# Altium footprint library 3.03-USB3.1 Type C-M.2-NGFF-HDMI-PCI-E接口.PcbLib: 40 footprints (part 2 of 3)
Each footprint in its own frame and in the unit in brackets; x right, y up, seen from the top. Pads: shape width x height; smd on the part's side, far side on the other; paste and mask are expansions set on the pad; w line width, h text height; cw(c..) or ccw(c..) is an arc to the next point about the centre after c.
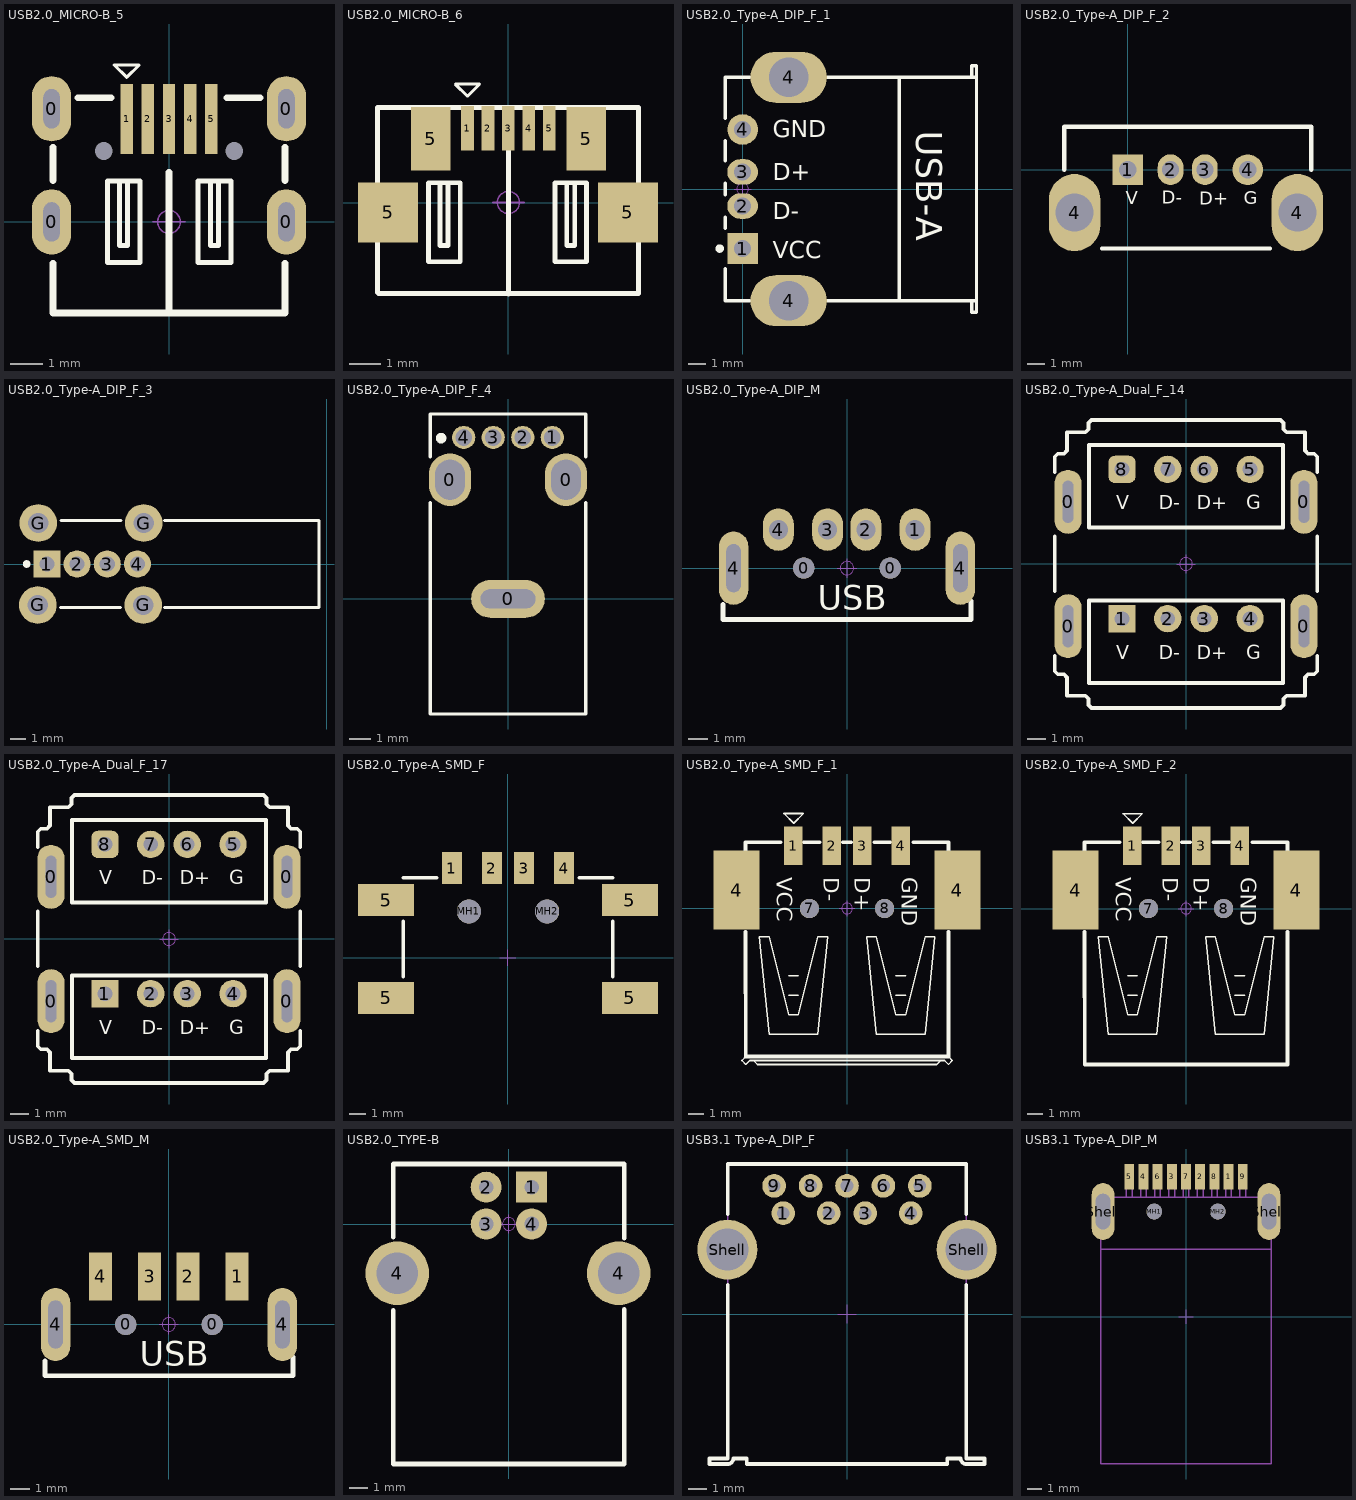
[diagram p1: the footprints below, top view; thin cyan lines are the x and y axes]

## USB2.0_MICRO-B_5 [mm] "micro型USB ，6.7*7.5*2.5mm封装库来自淘宝ID:黄晶宝石"
pads (11):
  oval 1.2x2 hole 0.5 slot 1.2 at 90 deg: 0(-3.6,0) 0(-3.6,3.47) 0(3.6,0) 0(3.6,3.47)
  round 0 hole 0.55 unplated: 0(-2,2.17) 0(2,2.17)
  rect 0.381x2.15 smd: 1(-1.3,3.16) 2(-0.65,3.16) 3(0,3.16) 4(0.65,3.16) 5(1.3,3.16)
Top Overlay:
  lines w0.1: -1.681,4.811 -1.3,4.43 -0.919,4.811 -1.681,4.811
  lines w0.152: -1.524,1.257 -1.524,-0.728 -1.321,-0.728 -1.27,-0.728 -1.27,1.257 ; 1.27,1.257 1.27,-0.728 1.524,-0.728 1.524,1.257 ; -1.885,-1.243 -1.885,1.257 -0.885,1.257 -0.885,-1.243 -1.885,-1.243 ; 0.896,-1.243 1.896,-1.243 1.896,1.257 0.896,1.257 0.896,-1.243
  lines w0.203: -3.556,-1.27 -3.556,-2.794 3.556,-2.794 3.556,-1.27 ; -3.556,1.27 -3.556,2.286 ; -2.794,3.81 -1.778,3.81 ; 0,-2.75 0,1.524 ; 1.778,3.81 2.794,3.81 ; 3.556,1.27 3.556,2.286
Mechanical 15:
  circle w0.05: c0,0 r0.35
  lines w0.05: -0.5,0 0.5,0 ; 0,-0.5 0,0.5
3D body "USB_MICRO_d.STEP": height 2.79, standoff -0.95, extent -3.985,-2.75 3.985,3.95

## USB2.0_MICRO-B_6 [mm] "micro型USB ，5.9*8.2*2.5mm  封装库来自淘宝ID:黄晶宝石"
pads (9):
  rect 0.4x1.4 smd: 1(-1.296,2.355) 2(-0.648,2.355) 3(0,2.355) 4(0.648,2.355) 5(1.295,2.355)
  rect 1.9x1.9 smd: 5(-3.81,-0.312) 5(3.784,-0.312)
  rect 1.25x2 smd: 5(-2.464,2.025) 5(2.464,2.025)
Top Overlay:
  lines w0.1: -1.677,3.752 -0.915,3.752 -1.296,3.371 -1.677,3.752
  lines w0.152: -4.14,-2.852 -4.14,3.016 ; -4.115,-2.877 4.089,-2.877 ; -4.09,3.016 4.089,3.016 ; -2.165,0.628 -2.165,-1.357 -1.962,-1.357 -1.911,-1.357 -1.911,0.628 ; 0,-2.889 0,2.99 ; 1.848,0.628 1.848,-1.357 2.102,-1.357 2.102,0.628 ; 4.115,-2.877 4.115,3.016 ; -2.526,-1.872 -1.526,-1.872 -1.526,0.628 -2.526,0.628 -2.526,-1.872 ; 1.474,-1.872 1.474,0.628 2.474,0.628 2.474,-1.872 1.474,-1.872
Mechanical 15:
  circle w0.05: c0,0.006 r0.35
  lines w0.05: -0.5,0.006 0.5,0.006 ; 0,-0.494 0,0.506
3D body "usb-micro_b0.stp": height 2.69, standoff -0.24, extent -3.982,-2.766 3.982,2.655

## USB2.0_Type-A_DIP_F_1 [mm] "USB2.0_Type-A直插母座"
height 7.01
pads (6):
  rect 1.8x1.8 hole 1: 1(0,-3.5)
  oval 1.8x1.5 hole 1: 2(0,-1) 3(0,1)
  round 1.8 hole 1: 4(0,3.5)
  oval 4.5x3 hole 2.3: 4(2.71,-6.57) 4(2.71,6.57)
Top Overlay:
  circle w0.25: c-1.35,-3.5 r0.125
  lines w0.2: -1.01,-4.7 -1.01,-6.565 0.41,-6.565 ; -1.01,-2.3 -1.01,-1.66 ; -1.01,-0.34 -1.01,0.34 ; -1.01,1.66 -1.01,2.84 ; -1.01,4.16 -1.01,6.565 0.41,6.565 ; 5.01,-6.565 13.752,-6.565 ; 5.01,6.565 13.752,6.565 ; 13.462,-6.565 13.462,-7.25 13.752,-7.25 13.752,7.25 13.462,7.25 13.462,6.565
  lines w0.203: 9.21,-6.565 9.21,6.565
  text "GND" at 1.778,3.048 h1.02
  text "D+" at 1.778,0.508 h1.02
  text "D-" at 1.778,-1.778 h1.02
  text "VCC" at 1.778,-4.064 h1.02
  text "USB-A" at 10.21,3.43 h1.52
Mechanical 15:
  circle w0.05: c0,0 r0.35
  lines w0.05: -0.5,0 0.5,0 ; 0,-0.5 0,0.5
3D body "USB_A_S.STEP": height 6.8, standoff -4.31, extent -0.605,-7.342 13.7,7.342

## USB2.0_Type-A_DIP_F_2 [mm] "USB2.0_Type-A直插母座"
pads (6):
  rect 1.8x1.8 hole 1: 1(0,0)
  oval 1.5x1.8 hole 1: 2(2.5,0) 3(4.5,0)
  oval 3x4.5 hole 2.2: 4(-3.1,-2.5) 4(9.9,-2.5)
  round 1.8 hole 1: 4(7,0)
Top Overlay:
  lines w0.254: -3.7,0 -3.7,2.5 10.7,2.5 10.7,0 ; -1.5,-4.6 8.3,-4.6
  text "D-" at 1.996,-1.981 h0.76
  text "D+" at 4.181,-2.032 h0.76
  text "G" at 6.771,-2.007 h0.76
  text "V" at -0.112,-2.007 h0.76
3D body "USB-H.stp": height 14, standoff -4, extent -3.705,-4.599 10.695,2.501

## USB2.0_Type-A_DIP_F_3 [mm] "USB2.0_Type-A直插立式母座"
pads (8):
  rect 1.8x1.8 hole 1: 1(-18.56,0)
  round 1.8 hole 1: 2(-16.56,0) 3(-14.56,0) 4(-12.56,0)
  round 2.5 hole 1.35: G(-19.167,-2.718) G(-19.141,2.718) G(-12.167,-2.718) G(-12.141,2.718)
Top Overlay:
  circle w0.25: c-19.91,0 r0.125
  lines w0.2: -17.65,-2.878 -13.684,-2.878 ; -17.624,2.878 -13.658,2.878 ; -10.773,-2.88 -0.508,-2.88 -0.508,2.88 -10.773,2.88
3D body "USB-4H4.stp": height 14.45, standoff -3.69, extent -19.725,-3.606 -0.475,3.644

## USB2.0_Type-A_DIP_F_4 [mm] "USB2.0_Type-A侧插短体无卷边 90度母座"
pads (7):
  oval 2x2.5 hole 1.4 slot 1.9 at 90 deg: 0(-2.75,5.65) 0(2.75,5.65)
  oval 3.5x1.8 hole 0.9 slot 2.6 at 0 deg: 0(0,0)
  round 1.1 hole 0.8: 1(2.1,7.65) 2(0.7,7.65) 3(-0.7,7.65) 4(-2.1,7.65)
Top Overlay:
  circle w0.25: c-3.173,7.62 r0.125
  lines w0.152: -3.683,4.572 -3.683,-5.461 3.683,-5.461 3.683,4.572 ; -3.683,6.731 -3.683,8.763 3.683,8.763 3.683,6.731
3D body "USB_a0.STEP": height 13.7, standoff -3.05, extent -3.56,-5.35 3.56,8.65

## USB2.0_Type-A_DIP_M [mm] "USB2.0_Type-A直插公头，20*13*4.5mm"
height 1.75
pads (8):
  round 1.1 hole 1.1: 0(-2.25,0) 0(2.25,0)
  oval 1.6x2.2 hole 1: 1(3.543,2) 2(0.987,2) 3(-1.013,2) 4(-3.569,2)
  oval 1.524x3.81 hole 0.762 slot 2.5 at 90 deg: 4(-5.9,0) 4(5.9,0)
Top Overlay:
  lines w0.254: -6.45,-1.9 -6.45,-2.667 6.45,-2.667 6.45,-1.7
  text "USB" at -1.524,-2.159 h1.27
Mechanical 15:
  circle w0.05: c0,0 r0.35
  lines w0.05: -0.5,0 0.5,0 ; 0,-0.5 0,0.5
3D body "USB_A_TH.step": height 2.01, standoff -3.76, extent -6.473,-17.9 6.474,2.105

## USB2.0_Type-A_Dual_F_14 [mm] "双层USB母座高14.2mm"
pads (12):
  oval 1.5x3.5 hole 0.6 slot 2.3 at 90 deg: 0(-6.45,-3.4) 0(-6.45,3.4) 0(6.45,-3.4) 0(6.45,3.4)
  rect 1.5x1.5 hole 0.8: 1(-3.5,-2.985)
  round 1.5 hole 0.8: 2(-1,-2.985) 3(1,-2.985) 4(3.5,-2.985) 5(3.5,5.17) 6(1,5.17) 7(-1,5.17)
  rrect50% 1.5x1.5 hole 0.8: 8(-3.5,5.17)
Top Overlay:
  lines w0.203: -7.176,-5.024 -7.176,-5.863 -7.007,-6.031 -6.67,-6.031 -6.501,-6.2 -6.5,-6.199 -6.5,-7.199 -5.5,-7.199 -5.331,-7.369 -5.331,-7.706 -5.163,-7.875 5.162,-7.875 5.331,-7.706 5.331,-7.369 5.5,-7.2 6.5,-7.199 6.5,-6.199 6.501,-6.2 6.67,-6.031 7.007,-6.031 7.176,-5.863 7.176,-5.024 ; -7.176,-1.476 -7.176,1.524 ; -7.176,5.024 -7.176,5.862 -7.007,6.031 -6.67,6.031 -6.501,6.2 -6.5,6.199 -6.5,7.199 -5.5,7.199 ; -5.5,7.2 -5.331,7.369 -5.331,7.706 -5.163,7.875 5.162,7.875 5.331,7.706 5.331,7.369 5.5,7.2 6.5,7.199 6.5,6.199 6.501,6.2 6.67,6.031 7.007,6.031 7.176,5.863 7.176,5.024 ; 7.176,-1.476 7.176,1.524 ; -5.3,-6.5 -5.3,-2 5.3,-2 5.3,-6.5 -5.3,-6.5 ; -5.3,2 5.3,2 5.3,6.5 -5.3,6.5 -5.3,2
  text "V" at -3.812,2.993 h0.76
  text "G" at 3.3,3 h0.76
  text "D+" at 0.6,3 h0.76
  text "D-" at -1.5,3 h0.76
  text "D-" at -1.5,-5.2 h0.76
  text "D+" at 0.6,-5.2 h0.76
  text "G" at 3.3,-5.2 h0.76
  text "V" at -3.812,-5.207 h0.76
Mechanical 15:
  circle w0.05: c0,0 r0.35
  lines w0.05: -0.5,0 0.5,0 ; 0,-0.5 0,0.5
3D body "USB_a14-14_2-180.STEP": height 3.52, standoff -14.77, extent -7.927,-7.8 7.926,7.8

## USB2.0_Type-A_Dual_F_17 [mm] "双层USB母座高16.7mm"
pads (12):
  oval 1.5x3.5 hole 0.6 slot 2.3 at 90 deg: 0(-6.45,-3.4) 0(-6.45,3.4) 0(6.45,-3.4) 0(6.45,3.4)
  rect 1.5x1.5 hole 0.8: 1(-3.5,-2.985)
  round 1.5 hole 0.8: 2(-1,-2.985) 3(1,-2.985) 4(3.5,-2.985) 5(3.5,5.17) 6(1,5.17) 7(-1,5.17)
  rrect50% 1.5x1.5 hole 0.8: 8(-3.5,5.17)
Top Overlay:
  lines w0.203: -7.176,-5.024 -7.176,-5.863 -7.007,-6.031 -6.67,-6.031 -6.501,-6.2 -6.5,-6.199 -6.5,-7.199 -5.5,-7.199 -5.331,-7.369 -5.331,-7.706 -5.163,-7.875 5.162,-7.875 5.331,-7.706 5.331,-7.369 5.5,-7.2 6.5,-7.199 6.5,-6.199 6.501,-6.2 6.67,-6.031 7.007,-6.031 7.176,-5.863 7.176,-5.024 ; -7.176,-1.476 -7.176,1.524 ; -7.176,5.024 -7.176,5.862 -7.007,6.031 -6.67,6.031 -6.501,6.2 -6.5,6.199 -6.5,7.199 -5.5,7.199 ; -5.5,7.2 -5.331,7.369 -5.331,7.706 -5.163,7.875 5.162,7.875 5.331,7.706 5.331,7.369 5.5,7.2 6.5,7.199 6.5,6.199 6.501,6.2 6.67,6.031 7.007,6.031 7.176,5.863 7.176,5.024 ; 7.176,-1.476 7.176,1.524 ; -5.3,-6.5 -5.3,-2 5.3,-2 5.3,-6.5 -5.3,-6.5 ; -5.3,2 5.3,2 5.3,6.5 -5.3,6.5 -5.3,2
  text "V" at -3.812,2.993 h0.76
  text "G" at 3.3,3 h0.76
  text "D+" at 0.6,3 h0.76
  text "D-" at -1.5,3 h0.76
  text "D-" at -1.5,-5.2 h0.76
  text "D+" at 0.6,-5.2 h0.76
  text "G" at 3.3,-5.2 h0.76
  text "V" at -3.812,-5.207 h0.76
Mechanical 15:
  circle w0.05: c0,0 r0.35
  lines w0.05: -0.5,0 0.5,0 ; 0,-0.5 0,0.5
3D body "USB_a14-16_7-180.STEP": height 3.52, standoff -17.26, extent -7.927,-7.8 7.927,7.8

## USB2.0_Type-A_SMD_F [mm] "USB 2.0 Type A                    封装库来自淘宝ID:黄晶宝石"
height 6.3
pads (10):
  rect 1.25x2 smd: 1(-3.5,5.6) 2(-1,5.6) 3(1,5.6) 4(3.5,5.6)
  rect 3.5x2 smd: 5(-7.625,-2.5) 5(-7.625,3.6) 5(7.625,-2.5) 5(7.625,3.6)
  round 1.5 hole 1.5 unplated: MH1(-2.45,2.9) MH2(2.45,2.9)
Top Overlay:
  lines w0.2: -6.55,-1.2 -6.55,2.3 ; -6.55,5 -4.45,5 ; 4.45,5 6.55,5 ; 6.55,-1.2 6.55,2.3
Mechanical 15:
  lines w0.05: -0.5,0 0.5,0 ; 0,-0.5 0,0.5
3D body "usb_2_0_type_a_asm.stp": height 6.29, standoff -0.13, extent -8.25,-4.944 8.25,6.165

## USB2.0_Type-A_SMD_F_1 [mm] "USB2.0_Type-A贴片母座"
pads (8):
  rect 1.2x2.5 smd: 1(-3.5,4.1) 2(-1,4.1) 3(1,4.1) 4(3.5,4.1)
  rect 3x5.15 smd: 4(-7.2,1.2) 4(7.2,1.2)
  round 1.25 hole 1.25 unplated: 7(-2.45,0) 8(2.45,0)
Top Overlay:
  lines w0.1: -6.597,-9.652 -6.851,-9.906 -6.597,-10.16 -6.343,-9.906 -6.089,-9.906 ; -3.803,-5.649 -3.168,-5.649 ; -3.803,-4.379 -3.168,-4.379 ; 3.182,-5.649 3.817,-5.649 ; 3.182,-4.379 3.817,-4.379 ; 6.611,-9.652 6.865,-9.906 6.611,-10.16 6.357,-9.906 6.103,-9.906 ; -6.089,-9.906 6.103,-9.906 ; -6.089,-9.906 -5.835,-10.166 5.849,-10.166 6.103,-9.906 ; -5.708,-1.839 -5.073,-1.839 -3.803,-6.919 -3.168,-6.919 -1.898,-1.839 -1.263,-1.839 -1.898,-8.189 -5.073,-8.189 -5.708,-1.839 ; -4.113,6.19 -2.843,6.19 -3.478,5.555 -4.113,6.19 ; 1.277,-1.839 1.912,-1.839 3.182,-6.919 3.817,-6.919 5.087,-1.839 5.722,-1.839 5.087,-8.189 1.912,-8.189 1.277,-1.839
  lines w0.254: -6.604,-1.524 -6.597,-9.652 ; -6.604,3.81 -6.604,4.318 -4.318,4.318 ; -6.597,-9.652 6.611,-9.652 ; -2.794,4.318 -1.778,4.318 ; -0.254,4.318 0.254,4.318 ; 1.778,4.318 2.794,4.318 ; 4.318,4.318 6.611,4.318 6.604,3.81 ; 6.604,-1.524 6.611,-9.652
  text "VCC" at -4.572,2.032 h1.02
  text "D-" at -1.524,2.032 h1.02
  text "D+" at 0.508,2.032 h1.02
  text "GND" at 3.556,2.032 h1.02
Mechanical 15:
  circle w0.05: c0,0 r0.35
  lines w0.05: -0.5,0 0.5,0 ; 0,-0.5 0,0.5
3D body "USB_A_R2.STEP": height 7.4, standoff -0.55, extent -7.75,-9.9 7.75,4.8

## USB2.0_Type-A_SMD_F_2 [mm] "USB2.0_Type-A贴片母座，无卷边"
pads (8):
  rect 1.2x2.5 smd: 1(-3.5,4.1) 2(-1,4.1) 3(1,4.1) 4(3.5,4.1)
  rect 3x5.15 smd: 4(-7.2,1.2) 4(7.2,1.2)
  round 1.25 hole 1.25 unplated: 7(-2.45,0) 8(2.45,0)
Top Overlay:
  lines w0.1: -3.803,-5.649 -3.168,-5.649 ; -3.803,-4.379 -3.168,-4.379 ; 3.182,-5.649 3.817,-5.649 ; 3.182,-4.379 3.817,-4.379 ; -5.708,-1.839 -5.073,-8.189 -1.898,-8.189 -1.263,-1.839 -1.898,-1.839 -3.168,-6.919 -3.803,-6.919 -5.073,-1.839 -5.708,-1.839 ; -4.113,6.19 -3.478,5.555 -2.843,6.19 -4.113,6.19 ; 1.277,-1.839 1.912,-8.189 5.087,-8.189 5.722,-1.839 5.087,-1.839 3.817,-6.919 3.182,-6.919 1.912,-1.839 1.277,-1.839
  lines w0.254: -6.604,-1.524 -6.597,-10.16 6.611,-10.16 6.604,-1.524 ; -6.604,3.81 -6.604,4.318 -4.318,4.318 ; -2.794,4.318 -1.778,4.318 ; -0.254,4.318 0.254,4.318 ; 1.778,4.318 2.794,4.318 ; 4.318,4.318 6.611,4.318 6.604,3.81
  text "GND" at 3.556,2.032 h1.02
  text "D+" at 0.508,2.032 h1.02
  text "D-" at -1.524,2.032 h1.02
  text "VCC" at -4.572,2.032 h1.02
Mechanical 15:
  circle w0.05: c0,0 r0.35
  lines w0.05: -0.5,0 0.5,0 ; 0,-0.5 0,0.5
3D body "USB_R_SMD.STEP": height 6.9, standoff -0.55, extent -7.75,-9.9 7.75,4.8

## USB2.0_Type-A_SMD_M [mm] "USB2.0_Type-A贴片公头，20*13*4.5mm"
height 1.75
pads (8):
  round 1.1 hole 1.1: 0(-2.237,0) 0(2.263,0)
  rect 1.2x2.5 smd: 1(3.556,2.508) 2(1,2.508) 3(-1,2.508) 4(-3.556,2.508)
  oval 1.524x3.81 hole 0.762 slot 2.5 at 90 deg: 4(-5.887,0) 4(5.913,0)
Top Overlay:
  lines w0.254: -6.437,-1.9 -6.437,-2.667 6.463,-2.667 6.463,-1.7
  text "USB" at -1.511,-2.159 h1.27
Mechanical 15:
  circle w0.05: c0,0 r0.35
  lines w0.05: -0.5,0 0.5,0 ; 0,-0.5 0,0.5
3D body "USB_A_SMD.STEP": height 3.25, standoff -2.52, extent -6.474,-17.9 6.473,2.7

## USB2.0_TYPE-B [mm] "b型USB 母座 16.3*13.7*11mm封装库来自淘宝ID:黄晶宝石"
height 1.1
pads (6):
  rect 1.7x1.7 hole 0.8: 1(1.25,2.032)
  round 1.7 hole 0.8: 2(-1.25,2.032) 3(-1.25,0) 4(1.25,0)
  round 3.5 hole 2.3: 4(-6.141,-2.71) 4(6.051,-2.71)
Top Overlay:
  lines w0.254: -6.35,-4.737 -6.35,-13.208 6.35,-13.208 6.35,-4.686 ; -6.35,-0.724 -6.35,3.302 6.35,3.302 6.35,-0.775
Mechanical 15:
  circle w0.05: c0,0 r0.35
  lines w0.05: -0.5,0 0.5,0 ; 0,-0.5 0,0.5
3D body "USB_b0.STEP": height 11.45, standoff -2.95, extent -6.86,-13.16 6.859,3.14

## USB3.1 Type-A_DIP_F [mm] "USB3.1 Type A Horizontal"
height 6.99
pads (11):
  round 1.3 hole 0.7: 1(-3.5,5.54) 2(-1,5.54) 3(1,5.54) 4(3.5,5.54) 5(4,7.04) 6(2,7.04) 7(0,7.04) 8(-2,7.04) 9(-4,7.04)
  round 3.3 hole 2.3: Shell(-6.57,3.54) Shell(6.57,3.54)
Top Overlay:
  lines w0.2: -6.55,1.61 -6.55,-7.94 -7.55,-7.94 -7.55,-8.24 -6.56,-8.24 ccw(c-6.55,-7.94) -6.25,-7.94 -5.5,-7.94 -5.5,-8.24 5.5,-8.24 5.5,-7.94 6.25,-7.94 ccw(c6.55,-7.94) 6.56,-8.24 7.55,-8.24 7.55,-7.94 6.55,-7.94 6.55,1.61 ; -6.55,5.47 -6.55,8.24 6.55,8.24 6.55,5.47
Mechanical 13:
  lines w0.1: -7.55,-8.24 -7.55,-7.94 -6.55,-7.94 -6.55,8.24 6.55,8.24 6.55,-7.94 7.55,-7.94 7.55,-8.24 6.56,-8.24 cw(c6.55,-7.94) 6.25,-7.94 5.5,-7.94 5.5,-8.24 -5.5,-8.24 -5.5,-7.94 -6.25,-7.94 cw(c-6.55,-7.94) -6.56,-8.24 -7.55,-8.24
Mechanical 15:
  lines w0.05: -0.5,0 0.5,0 ; 0,-0.5 0,0.5
3D body "USB3.1 Type-A_DIP_F6.stp": height 8.26, standoff -2.96, extent -7.739,-8.3 7.74,8.25

## USB3.1 Type-A_DIP_M [mm] "USB 3.0 Type A SMT Plug with Clip"
height 4.5
pads (13):
  rect 0.7x1.8 smd: 1(3,9.875) 2(1,9.875) 3(-1,9.875) 4(-3,9.875) 5(-4,9.875) 6(-2,9.875) 7(0,9.875) 8(2,9.875) 9(4,9.875)
  round 1.1 hole 1.1 unplated: MH1(-2.25,7.425) MH2(2.25,7.425)
  oval 1.6x4 hole 1 slot 2.5 at 90 deg: Shell(-5.85,7.425) Shell(5.85,7.425)
Mechanical 1:
  lines w0.1: -6,4.775 6,4.775
  text "PCB Edge" at -1.8,3.9 h0.61
Mechanical 13:
  lines w0.1: -4.2,8.425 -4.2,10.375 -3.8,10.375 -3.8,8.425 ; -3.2,8.425 -3.2,10.375 -2.8,10.375 -2.8,8.425 ; -2.2,8.425 -2.2,10.375 -1.8,10.375 -1.8,8.425 ; -1.2,8.425 -1.2,10.375 -0.8,10.375 -0.8,8.425 ; -0.2,8.425 -0.2,10.375 0.2,10.375 0.2,8.425 ; 0.8,8.425 0.8,10.375 1.2,10.375 1.2,8.425 ; 1.8,8.425 1.8,10.375 2.2,10.375 2.2,8.425 ; 2.8,8.425 2.8,10.375 3.2,10.375 3.2,8.425 ; 3.8,8.425 3.8,10.375 4.2,10.375 4.2,8.425 ; -6,-10.375 -6,8.425 6,8.425 6,-10.375 -6,-10.375
Mechanical 15:
  lines w0.05: -0.5,0 0.5,0 ; 0,-0.5 0,0.5
3D body "USB3.1 Type-A_DIP_M3.stp": height 1.9, standoff -2.6, extent -5.969,-10.375 6.031,10.375